# Altium footprint library THD Connectors-1.PcbLib: 129 footprints (part 9 of 9)
Each footprint in its own frame and in the unit in brackets; x right, y up, seen from the top. Pads: shape width x height; smd on the part's side, far side on the other; paste and mask are expansions set on the pad; w line width, h text height; cw(c..) or ccw(c..) is an arc to the next point about the centre after c.
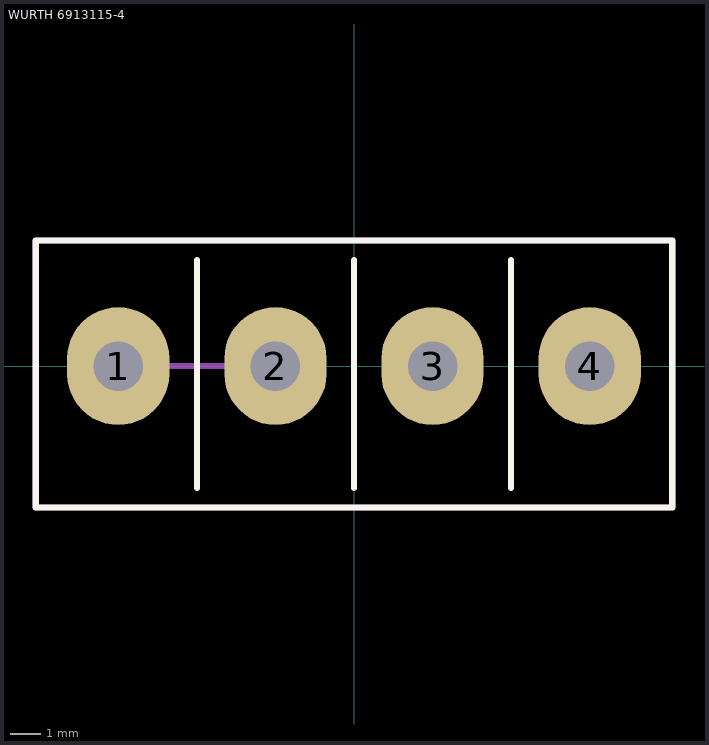
[diagram p8: the footprint, top view; thin cyan lines are the x and y axes]

## WURTH 6913115-4 [mil]
height 650
pads (4):
  oval 130x150 hole 63: 1(-300,0) 2(-100,0) 3(100,0) 4(300,0)
Top Overlay:
  lines w7.87: -200,-155 -200,135 ; 0,-155 0,135 ; 200,-155 200,135 ; -405,-180 -405,160 405,160 405,-180 -405,-180
Mechanical 1:
  lines w7.87: -405,-180 -405,160 405,160 405,-180 -405,-180
Mechanical 15:
  lines w7.87: -239.37,0 -160.63,0 ; -200,-39.37 -200,39.37 ; -405,-180 -405,160 405,160 405,-180 -405,-180
3D body "691311500004 (rev1).stp": height 486.22, standoff -143.7, extent -399.99,-175.19 400.01,159.46